# Altium footprint library My Footprint 3D.PCBLIB: 447 footprints (part 18 of 29)
Each footprint in its own frame and in the unit in brackets; x right, y up, seen from the top. Pads: shape width x height; smd on the part's side, far side on the other; paste and mask are expansions set on the pad; w line width, h text height; cw(c..) or ccw(c..) is an arc to the next point about the centre after c.
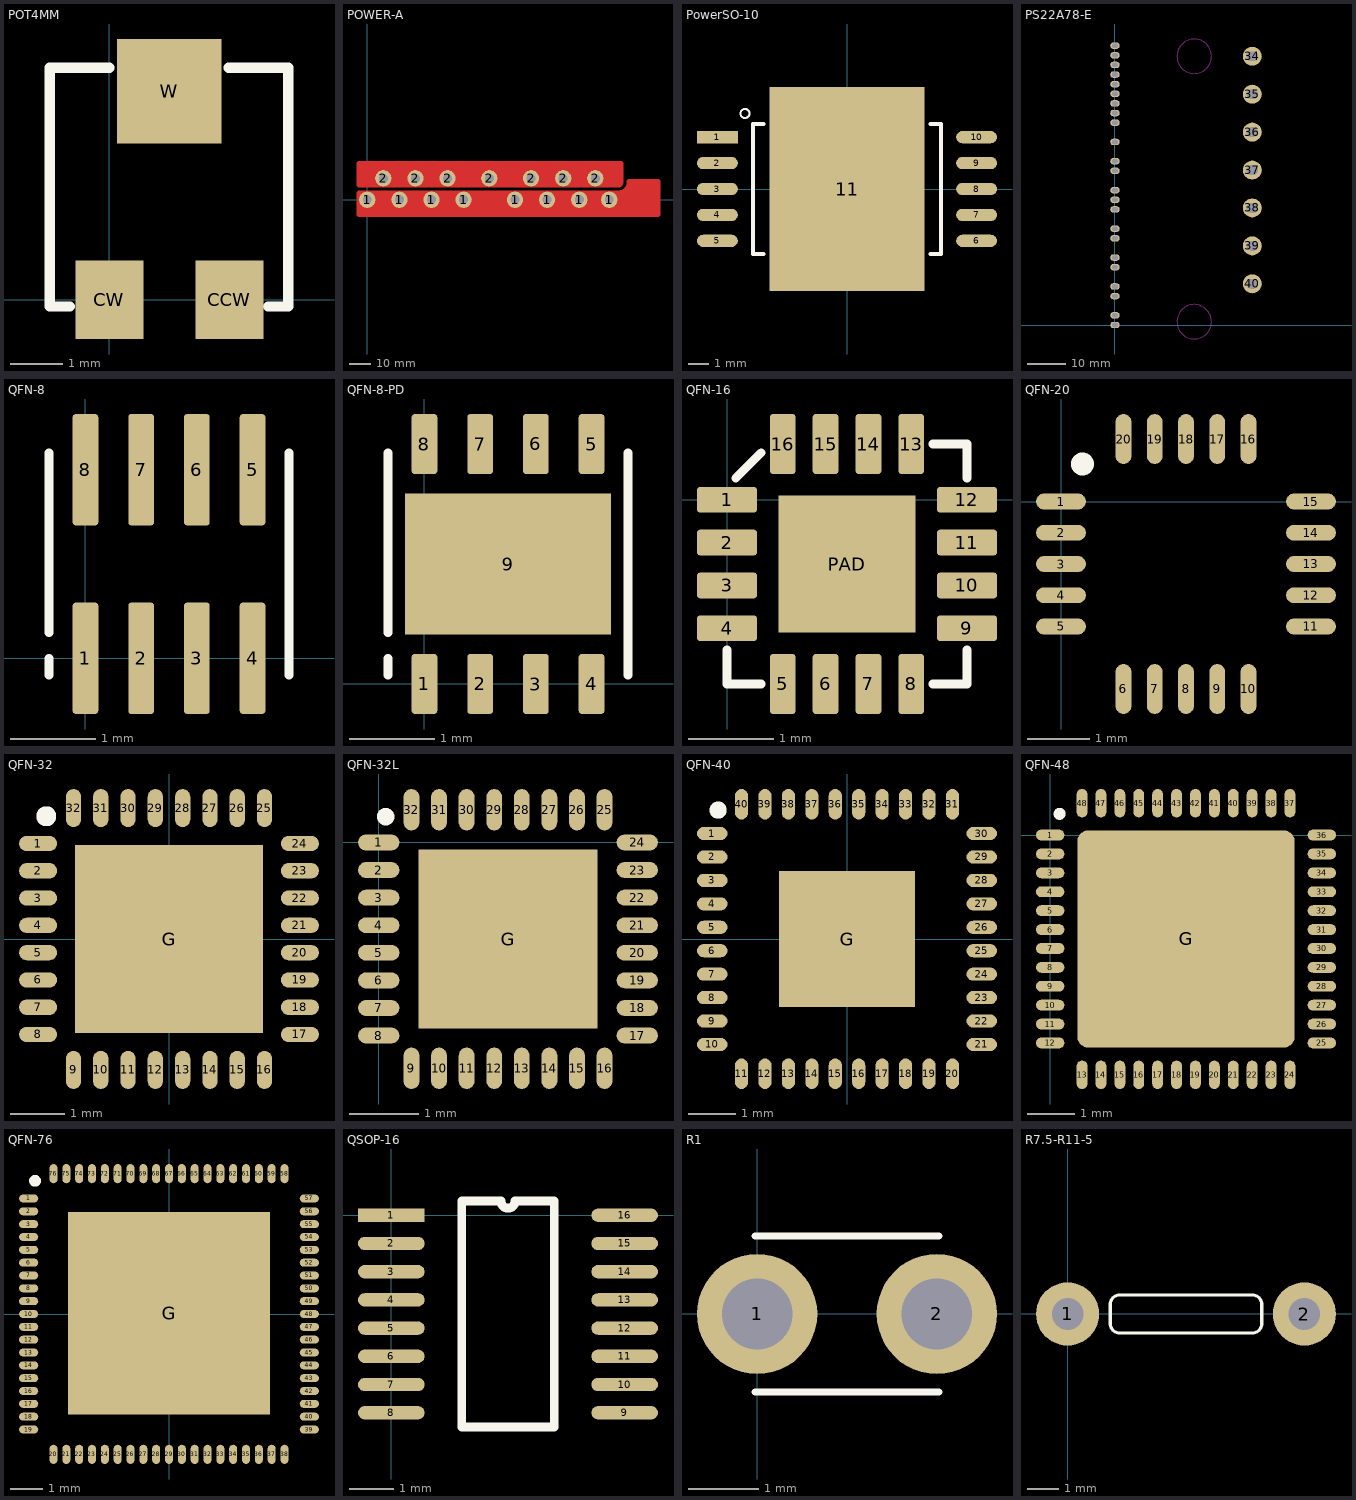
[diagram p17: the footprints below, top view; thin cyan lines are the x and y axes]

## POT4MM [mm] "Body 4.5X4.5mm"
height 2.55
pads (3):
  rect 1.3x1.5 smd: CCW(2.3,0) CW(0,0)
  rect 2x2 smd: W(1.15,4)
Top Overlay:
  lines w0.2: -0.762,-0.127 -1.143,-0.127 -1.143,4.445 0,4.445 ; 2.286,4.445 3.429,4.445 3.429,-0.127 3.048,-0.127

## POWER-A [mm]
pads (15):
  round 7.62 hole 4.2: 1(0,0) 1(15,0) 1(30,0) 1(45,0) 1(69,0) 1(84,0) 1(99,0) 1(113,0) 2(7.5,10) 2(22.5,10) 2(37.5,10) 2(57,10) 2(76.5,10) 2(91.5,10) 2(106.5,10)
Top Layer:
  rectangle: 121.666,0.508 135.636,7.874
  rectangle: -3.048,5.715 117.221,18.034
  rectangle: -3.302,-8.001 135.255,4.318
  lines w1.27: 117.221,3.674 ccw(c117.221,8.255) 121.802,8.255
  lines w2.54: -2.54,-6.731 -3.81,-6.731 -3.81,3.048 -0.127,3.048 ; -2.286,16.764 -3.81,16.764 -3.81,6.985 -1.651,6.985 ; 115.316,16.764 118.491,16.764 118.491,9.906 ; 117.221,7.239 117.221,16.002 ; 120.523,3.683 122.047,5.207 ; 122.428,7.62 122.428,8.382 135.763,8.382 135.763,-6.731 135.001,-6.731
  lines w5.08: 109.22,8.255 117.221,8.255 117.221,12.319
Top Solder:
  rectangle: 117.475,-6.731 135.128,8.763
  rectangle: -4.318,-7.747 119.126,16.891
  lines w2.7: -3.81,-6.731 -3.81,16.764 118.491,16.764 118.491,8.382 135.763,8.382 135.763,-6.731 -3.81,-6.731

## PowerSO-10 [mm]
pads (11):
  rect 2x0.6 smd: 1(-6.35,2.54)
  oval 2x0.6 smd: 2(-6.35,1.27) 3(-6.35,0) 4(-6.35,-1.27) 5(-6.35,-2.54) 6(6.35,-2.54) 7(6.35,-1.27) 8(6.35,0) 9(6.35,1.27) 10(6.35,2.54)
  rect 7.6x10 smd: 11(0,0)
Top Overlay:
  circle w0.1: c-5,3.7 r0.224
  lines w0.2: -4.1,-3.175 -4.615,-3.175 -4.615,3.175 -4.1,3.175 ; 4.1,-3.175 4.615,-3.175 4.615,3.175 4.1,3.175
3D body: height 1.9, standoff 1.6, extent -5.7,-0.3 -4.7,0.3
3D body: height 1.9, standoff 0, extent -6,-0.3 -5.7,0.3
3D body: height 0.3, standoff 0, extent -7,-0.3 -6,0.3
3D body: height 3.5, standoff 0.01, extent -4.7,-3.8 4.7,3.8
3D body: height 1.3, standoff 0, extent -3.7,-4.799 3.7,4.801
3D body: height 0.3, standoff 0, extent -7,-1.57 -6,-0.97
3D body: height 1.9, standoff 0, extent -6,-1.57 -5.7,-0.97
3D body: height 1.9, standoff 1.6, extent -5.7,-1.57 -4.7,-0.97
3D body: height 0.3, standoff 0, extent -7,-2.84 -6,-2.24
3D body: height 1.9, standoff 0, extent -6,-2.84 -5.7,-2.24
3D body: height 1.9, standoff 1.6, extent -5.7,-2.84 -4.7,-2.24
3D body: height 0.3, standoff 0, extent -7,0.97 -6,1.57
3D body: height 1.9, standoff 0, extent -6,0.97 -5.7,1.57
3D body: height 1.9, standoff 1.6, extent -5.7,0.97 -4.7,1.57
3D body: height 0.3, standoff 0, extent -7,2.24 -6,2.84
3D body: height 1.9, standoff 0, extent -6,2.24 -5.7,2.84
3D body: height 1.9, standoff 1.6, extent -5.7,2.24 -4.7,2.84
3D body: height 1.9, standoff 1.6, extent 4.7,-2.84 5.7,-2.24
3D body: height 1.9, standoff 0, extent 5.7,-2.84 6,-2.24
3D body: height 0.3, standoff 0, extent 6,-2.84 7,-2.24
3D body: height 1.9, standoff 1.6, extent 4.7,-1.57 5.7,-0.97
3D body: height 1.9, standoff 0, extent 5.7,-1.57 6,-0.97
3D body: height 0.3, standoff 0, extent 6,-1.57 7,-0.97
3D body: height 1.9, standoff 1.6, extent 4.7,2.24 5.7,2.84
3D body: height 1.9, standoff 0, extent 5.7,2.24 6,2.84
3D body: height 0.3, standoff 0, extent 6,2.24 7,2.84
3D body: height 1.9, standoff 1.6, extent 4.7,0.97 5.7,1.57
3D body: height 1.9, standoff 0, extent 5.7,0.97 6,1.57
3D body: height 0.3, standoff 0, extent 6,0.97 7,1.57
3D body: height 0.3, standoff 0, extent 6,-0.3 7,0.3
3D body: height 1.9, standoff 0, extent 5.7,-0.3 6,0.3
3D body: height 1.9, standoff 1.6, extent 4.7,-0.3 5.7,0.3

## PS22A78-E [mm]
pads (30):
  oval 2.5x1.7 hole 1.1 slot 1.5 at 0 deg: 1(0,0) 3(0,2.54) 4(0,7.62) 6(0,10.16) 7(0,15.24) 9(0,17.78) 10(0,22.86) 12(0,25.4) 13(0,30.48) 14(0,33.02) 15(0,35.56) 16(0,40.64) 18(0,43.18) 19(0,48.26) 21(0,53.34) 22(0,55.88) 23(0,58.42) 24(0,60.96) 25(0,63.5) 26(0,66.04) 27(0,68.58) 28(0,71.12) 29(0,73.66)
  round 5 hole 2.5 slot 3 at 0 deg: 34(36.2,70.86) 35(36.2,60.86) 36(36.2,50.86) 37(36.2,40.86) 38(36.2,30.86) 39(36.2,20.86) 40(36.2,10.86)
Bottom Overlay:
  circle w0.5: c5.593,0.137 r1
  lines w0.254: 2,-3.64 2,26.63 8,26.63 8,29.53 2,29.53 2,44.41 8,44.41 8,47.31 2,47.31 2,75.36 33.6,75.36 33.6,-3.64 2,-3.64
Keep-Out Layer:
  lines w0.254: 20.822,75.409 ccw(c20.9,70.86) 20.925,75.41 ; 20.9,5.41 ccw(c20.9,0.86) 20.975,5.409

## QFN-8 [mm]
pads (8):
  rrect25% 0.3x1.3 smd mask+0.05: 1(0,0) 2(0.65,0) 3(1.3,0) 4(1.95,0) 5(1.95,2.2) 6(1.3,2.2) 7(0.65,2.2) 8(0,2.2)
Top Overlay:
  lines w0.1: -0.425,-0.2 -0.425,0 ; -0.425,0.3 -0.425,2.4 ; 2.375,-0.2 2.375,2.4
3D body: height 0.2, standoff 0, extent 1.825,-0.425 2.075,0.05
3D body: height 0.2, standoff 0, extent 1.175,-0.425 1.425,0.05
3D body: height 0.2, standoff 0, extent 0.525,-0.425 0.775,0.05
3D body: height 0.2, standoff 0, extent -0.125,-0.425 0.125,0.05
3D body: height 0.2, standoff 0, extent 1.825,2.15 2.075,2.625
3D body: height 0.2, standoff 0, extent 1.175,2.15 1.425,2.625
3D body: height 0.2, standoff 0, extent 0.525,2.15 0.775,2.625
3D body: height 0.91, standoff 0.9, extent -0.225,0 0.175,0.4
3D body: height 0.9, standoff 0.02, extent -0.525,-0.4 2.475,2.6
3D body: height 0.2, standoff 0, extent -0.125,2.15 0.125,2.625

## QFN-8-PD [mm]
pads (9):
  rrect25% 0.3x0.7 smd mask+0.05: 1(0,0) 2(0.65,0) 3(1.3,0) 4(1.95,0) 5(1.95,2.8) 6(1.3,2.8) 7(0.65,2.8) 8(0,2.8)
  rect 2.4x1.65 smd mask+0.05: 9(0.975,1.4)
Top Overlay:
  lines w0.1: -0.425,0.1 -0.425,0.3 ; -0.425,0.6 -0.425,2.7 ; 2.375,0.1 2.375,2.7
3D body: height 0.2, standoff 0, extent -0.125,2.45 0.125,2.925
3D body: height 0.9, standoff 0.02, extent -0.525,-0.1 2.475,2.9
3D body: height 0.01, standoff 0, extent -0.225,0.6 2.175,2.2
3D body: height 0.91, standoff 0.9, extent -0.225,0.3 0.175,0.7
3D body: height 0.2, standoff 0, extent 0.525,2.45 0.775,2.925
3D body: height 0.2, standoff 0, extent 1.175,2.45 1.425,2.925
3D body: height 0.2, standoff 0, extent 1.825,2.45 2.075,2.925
3D body: height 0.2, standoff 0, extent -0.125,-0.125 0.125,0.35
3D body: height 0.2, standoff 0, extent 0.525,-0.125 0.775,0.35
3D body: height 0.2, standoff 0, extent 1.175,-0.125 1.425,0.35
3D body: height 0.2, standoff 0, extent 1.825,-0.125 2.075,0.35

## QFN-16 [mm]
pads (17):
  rrect25% 0.7x0.3 smd mask+0.05: 1(0,0) 2(0,-0.5) 3(0,-1) 4(0,-1.5) 9(2.8,-1.5) 10(2.8,-1) 11(2.8,-0.5) 12(2.8,0)
  rrect25% 0.3x0.7 smd mask+0.05: 5(0.65,-2.15) 6(1.15,-2.15) 7(1.65,-2.15) 8(2.15,-2.15) 13(2.15,0.65) 14(1.65,0.65) 15(1.15,0.65) 16(0.65,0.65)
  rect 1.6x1.6 smd mask+0.05: PAD(1.4,-0.75)
Top Overlay:
  lines w0.1: 0,-1.75 0,-2.15 0.4,-2.15 ; 0.1,0.25 0.4,0.55 ; 2.4,-2.15 2.8,-2.15 2.8,-1.75 ; 2.4,0.65 2.8,0.65 2.8,0.25
3D body: height 0.85, standoff 0.02, extent -0.1,-2.25 2.9,0.75
3D body: height 0.2, standoff 0, extent 0.525,0.25 0.775,0.775
3D body: height 0.2, standoff 0, extent 1.025,0.25 1.275,0.775
3D body: height 0.2, standoff 0, extent 1.525,0.25 1.775,0.775
3D body: height 0.2, standoff 0, extent 2.025,0.25 2.275,0.775
3D body: height 0.2, standoff 0, extent -0.125,-0.125 0.4,0.125
3D body: height 0.2, standoff 0, extent -0.125,-0.625 0.4,-0.375
3D body: height 0.2, standoff 0, extent -0.125,-1.125 0.4,-0.875
3D body: height 0.2, standoff 0, extent -0.125,-1.625 0.4,-1.375
3D body: height 0.2, standoff 0, extent 0.525,-2.275 0.775,-1.75
3D body: height 0.2, standoff 0, extent 1.025,-2.275 1.275,-1.75
3D body: height 0.2, standoff 0, extent 1.525,-2.275 1.775,-1.75
3D body: height 0.2, standoff 0, extent 2.025,-2.275 2.275,-1.75
3D body: height 0.2, standoff 0, extent 2.4,-1.625 2.925,-1.375
3D body: height 0.2, standoff 0, extent 2.4,-1.125 2.925,-0.875
3D body: height 0.2, standoff 0, extent 2.4,-0.625 2.925,-0.375
3D body: height 0.2, standoff 0, extent 2.4,-0.125 2.925,0.125
3D body: height 0.01, standoff 0, extent 0.6,-1.55 2.2,0.05
3D body: height 0.86, standoff 0.85, extent 0.2,0.05 0.6,0.45

## QFN-20 [mm]
pads (20):
  oval 0.8x0.254 smd: 1(0,0) 2(0,-0.5) 3(0,-1) 4(0,-1.5) 5(0,-2) 11(4,-2) 12(4,-1.5) 13(4,-1) 14(4,-0.5) 15(4,0)
  oval 0.254x0.8 smd: 6(1,-3) 7(1.5,-3) 8(2,-3) 9(2.5,-3) 10(3,-3) 16(3,1) 17(2.5,1) 18(2,1) 19(1.5,1) 20(1,1)
Top Overlay:
  circle w0.254: c0.344,0.6 r0.056
3D body: height 0.85, standoff 0.01, extent 0,-3 4,1
3D body: height 0.2, standoff 0, extent -0.025,-0.125 0.5,0.125
3D body: height 0.2, standoff 0, extent -0.025,-0.625 0.5,-0.375
3D body: height 0.2, standoff 0, extent -0.025,-1.125 0.5,-0.875
3D body: height 0.2, standoff 0, extent -0.025,-1.625 0.5,-1.375
3D body: height 0.2, standoff 0, extent -0.025,-2.125 0.5,-1.875
3D body: height 0.2, standoff 0, extent 2.875,-3.025 3.125,-2.5
3D body: height 0.2, standoff 0, extent 2.375,-3.025 2.625,-2.5
3D body: height 0.2, standoff 0, extent 1.875,-3.025 2.125,-2.5
3D body: height 0.2, standoff 0, extent 1.375,-3.025 1.625,-2.5
3D body: height 0.2, standoff 0, extent 0.875,-3.025 1.125,-2.5
3D body: height 0.2, standoff 0, extent 3.5,-0.125 4.025,0.125
3D body: height 0.2, standoff 0, extent 3.5,-0.625 4.025,-0.375
3D body: height 0.2, standoff 0, extent 3.5,-1.125 4.025,-0.875
3D body: height 0.2, standoff 0, extent 3.5,-1.625 4.025,-1.375
3D body: height 0.2, standoff 0, extent 3.5,-2.125 4.025,-1.875
3D body: height 0.2, standoff 0, extent 0.875,0.5 1.125,1.025
3D body: height 0.2, standoff 0, extent 1.375,0.5 1.625,1.025
3D body: height 0.2, standoff 0, extent 1.875,0.5 2.125,1.025
3D body: height 0.2, standoff 0, extent 2.375,0.5 2.625,1.025
3D body: height 0.2, standoff 0, extent 2.875,0.5 3.125,1.025
3D body: height 0.2, standoff 0, extent 0.7,-2.3 3.3,0.3

## QFN-32 [mm]
pads (33):
  oval 0.7x0.28 smd: 1(-2.4,1.75) 2(-2.4,1.25) 3(-2.4,0.75) 4(-2.4,0.25) 5(-2.4,-0.25) 6(-2.4,-0.75) 7(-2.4,-1.25) 8(-2.4,-1.75) 17(2.4,-1.75) 18(2.4,-1.25) 19(2.4,-0.75) 20(2.4,-0.25) 21(2.4,0.25) 22(2.4,0.75) 23(2.4,1.25) 24(2.4,1.75)
  oval 0.28x0.7 smd: 9(-1.75,-2.4) 10(-1.25,-2.4) 11(-0.75,-2.4) 12(-0.25,-2.4) 13(0.25,-2.4) 14(0.75,-2.4) 15(1.25,-2.4) 16(1.75,-2.4) 25(1.75,2.4) 26(1.25,2.4) 27(0.75,2.4) 28(0.25,2.4) 29(-0.25,2.4) 30(-0.75,2.4) 31(-1.25,2.4) 32(-1.75,2.4)
  rect 3.45x3.45 smd: G(0,0)
Top Overlay:
  circle w0.254: c-2.25,2.25 r0.056
3D body: height 0.3, standoff 0, extent -1.89,2.049 -1.61,2.51
3D body: height 0.3, standoff 0, extent -1.39,2.049 -1.11,2.51
3D body: height 0.3, standoff 0, extent -0.89,2.049 -0.61,2.51
3D body: height 0.3, standoff 0, extent -0.39,2.049 -0.11,2.51
3D body: height 0.3, standoff 0, extent 0.11,2.049 0.39,2.51
3D body: height 0.3, standoff 0, extent 0.61,2.049 0.89,2.51
3D body: height 0.3, standoff 0, extent 1.11,2.049 1.39,2.51
3D body: height 0.3, standoff 0, extent 1.61,2.049 1.89,2.51
3D body: height 0.3, standoff 0, extent 2.049,1.61 2.51,1.89
3D body: height 0.3, standoff 0, extent 2.049,1.11 2.51,1.39
3D body: height 0.3, standoff 0, extent 2.049,0.61 2.51,0.89
3D body: height 0.3, standoff 0, extent 2.049,0.11 2.51,0.39
3D body: height 0.3, standoff 0, extent 2.049,-0.39 2.51,-0.11
3D body: height 0.3, standoff 0, extent 2.049,-0.89 2.51,-0.61
3D body: height 0.3, standoff 0, extent 2.049,-1.39 2.51,-1.11
3D body: height 0.3, standoff 0, extent 2.049,-1.89 2.51,-1.61
3D body: height 0.3, standoff 0, extent 1.61,-2.51 1.89,-2.049
3D body: height 0.3, standoff 0, extent 1.11,-2.51 1.39,-2.049
3D body: height 0.3, standoff 0, extent 0.61,-2.51 0.89,-2.049
3D body: height 0.3, standoff 0, extent 0.11,-2.51 0.39,-2.049
3D body: height 0.3, standoff 0, extent -0.39,-2.51 -0.11,-2.049
3D body: height 0.3, standoff 0, extent -0.89,-2.51 -0.61,-2.049
3D body: height 0.3, standoff 0, extent -1.39,-2.51 -1.11,-2.049
3D body: height 0.3, standoff 0, extent -1.89,-2.51 -1.61,-2.049
3D body: height 0.3, standoff 0, extent -2.51,1.61 -2.049,1.89
3D body: height 0.3, standoff 0, extent -2.51,1.11 -2.049,1.39
3D body: height 0.3, standoff 0, extent -2.51,0.61 -2.049,0.89
3D body: height 0.3, standoff 0, extent -2.51,0.11 -2.049,0.39
3D body: height 0.3, standoff 0, extent -2.51,-0.39 -2.049,-0.11
3D body: height 0.3, standoff 0, extent -2.51,-0.89 -2.049,-0.61
3D body: height 0.3, standoff 0, extent -2.51,-1.39 -2.049,-1.11
3D body: height 0.3, standoff 0, extent -2.51,-1.89 -2.049,-1.61
3D body: height 0.3, standoff 0, extent -1.72,-1.72 1.72,1.72
3D body: height 0.85, standoff 0.02, extent -2.5,-2.5 2.5,2.5
3D body: height 0.86, standoff 0.85, extent -2.025,1.625 -1.625,2.025

## QFN-32L [mm] "4mmX4mm"
pads (33):
  oval 0.6x0.23 smd: 1(0,0) 2(0,-0.4) 3(0,-0.8) 4(0,-1.2) 5(0,-1.6) 6(0,-2) 7(0,-2.4) 8(0.001,-2.801) 17(3.751,-2.8) 18(3.751,-2.4) 19(3.751,-2) 20(3.751,-1.6) 21(3.75,-1.2) 22(3.75,-0.8) 23(3.75,-0.4) 24(3.75,0)
  oval 0.23x0.6 smd: 9(0.475,-3.275) 10(0.875,-3.275) 11(1.275,-3.275) 12(1.676,-3.275) 13(2.076,-3.275) 14(2.476,-3.275) 15(2.876,-3.275) 16(3.276,-3.275) 25(3.275,0.475) 26(2.875,0.475) 27(2.475,0.475) 28(2.075,0.475) 29(1.675,0.475) 30(1.275,0.475) 31(0.875,0.475) 32(0.475,0.475)
  rect 2.6x2.6 smd: G(1.875,-1.4)
Top Overlay:
  circle w0.254: c0.1,0.375 r0
3D body: height 0.25, standoff 0, extent 0.575,-2.7 3.175,-0.1
3D body: height 0.25, standoff 0, extent 3.475,-0.1 3.885,0.1
3D body: height 0.25, standoff 0, extent 3.176,0.2 3.376,0.61
3D body: height 0.25, standoff 0, extent 3.176,-3.41 3.376,-3
3D body: height 0.25, standoff 0, extent 3.475,-2.9 3.885,-2.7
3D body: height 0.25, standoff 0, extent -0.134,-2.9 0.276,-2.7
3D body: height 0.25, standoff 0, extent 0.375,-3.41 0.575,-3
3D body: height 0.8, standoff 0.02, extent -0.125,-3.4 3.875,0.6
3D body: height 0.25, standoff 0, extent -0.134,-0.1 0.276,0.1
3D body: height 0.25, standoff 0, extent 1.975,0.2 2.175,0.61
3D body: height 0.25, standoff 0, extent 1.575,0.2 1.775,0.61
3D body: height 0.25, standoff 0, extent 1.175,0.2 1.375,0.61
3D body: height 0.25, standoff 0, extent 0.775,0.2 0.975,0.61
3D body: height 0.25, standoff 0, extent 0.375,0.199 0.575,0.609
3D body: height 0.25, standoff 0, extent 2.375,0.2 2.575,0.61
3D body: height 0.25, standoff 0, extent 2.776,0.2 2.976,0.61
3D body: height 0.25, standoff 0, extent 3.475,-1.7 3.885,-1.5
3D body: height 0.25, standoff 0, extent 3.475,-1.3 3.885,-1.1
3D body: height 0.25, standoff 0, extent 3.475,-0.9 3.885,-0.7
3D body: height 0.25, standoff 0, extent 3.475,-0.5 3.885,-0.3
3D body: height 0.25, standoff 0, extent 3.475,-2.1 3.885,-1.9
3D body: height 0.25, standoff 0, extent 3.475,-2.5 3.885,-2.3
3D body: height 0.25, standoff 0, extent 1.575,-3.41 1.775,-3
3D body: height 0.25, standoff 0, extent 1.975,-3.41 2.175,-3
3D body: height 0.25, standoff 0, extent 2.375,-3.41 2.575,-3
3D body: height 0.25, standoff 0, extent 2.775,-3.41 2.975,-3
3D body: height 0.25, standoff 0, extent 1.175,-3.41 1.375,-3
3D body: height 0.25, standoff 0, extent 0.775,-3.41 0.975,-3
3D body: height 0.25, standoff 0, extent -0.134,-0.5 0.276,-0.3
3D body: height 0.25, standoff 0, extent -0.135,-0.9 0.275,-0.7
3D body: height 0.25, standoff 0, extent -0.134,-2.5 0.276,-2.3
3D body: height 0.25, standoff 0, extent -0.134,-2.1 0.276,-1.9
3D body: height 0.25, standoff 0, extent -0.135,-1.7 0.275,-1.5
3D body: height 0.25, standoff 0, extent -0.135,-1.3 0.275,-1.1
3D body: height 0.81, standoff 0.8, extent 0.227,-0.15 0.626,0.25

## QFN-40 [mm]
pads (41):
  oval 0.65x0.28 smd: 1(-2.875,2.25) 2(-2.875,1.75) 3(-2.875,1.25) 4(-2.875,0.75) 5(-2.875,0.25) 6(-2.875,-0.25) 7(-2.875,-0.75) 8(-2.875,-1.25) 9(-2.875,-1.75) 10(-2.875,-2.25) 21(2.875,-2.25) 22(2.875,-1.75) 23(2.875,-1.25) 24(2.875,-0.75) 25(2.875,-0.25) 26(2.875,0.25) 27(2.875,0.75) 28(2.875,1.25) 29(2.875,1.75) 30(2.875,2.25)
  oval 0.28x0.65 smd: 11(-2.25,-2.875) 12(-1.75,-2.875) 13(-1.25,-2.875) 14(-0.75,-2.875) 15(-0.25,-2.875) 16(0.25,-2.875) 17(0.75,-2.875) 18(1.25,-2.875) 19(1.75,-2.875) 20(2.25,-2.875) 31(2.25,2.875) 32(1.75,2.875) 33(1.25,2.875) 34(0.75,2.875) 35(0.25,2.875) 36(-0.25,2.875) 37(-0.75,2.875) 38(-1.25,2.875) 39(-1.75,2.875) 40(-2.25,2.875)
  rect 2.9x2.9 smd: G(0,0)
Top Overlay:
  circle w0.254: c-2.75,2.75 r0.056
3D body: height 0.2, standoff 0, extent 2.138,2.574 2.362,3.025
3D body: height 0.2, standoff 0, extent 1.638,2.574 1.862,3.025
3D body: height 0.2, standoff 0, extent 1.138,2.574 1.362,3.025
3D body: height 0.2, standoff 0, extent 0.638,2.574 0.862,3.025
3D body: height 0.2, standoff 0, extent 0.138,2.574 0.362,3.025
3D body: height 0.2, standoff 0, extent -0.362,2.574 -0.138,3.025
3D body: height 0.2, standoff 0, extent -0.862,2.574 -0.638,3.025
3D body: height 0.2, standoff 0, extent -1.362,2.574 -1.138,3.025
3D body: height 0.2, standoff 0, extent -1.862,2.574 -1.638,3.025
3D body: height 0.2, standoff 0, extent -2.362,2.574 -2.138,3.025
3D body: height 0.2, standoff 0, extent 2.574,-2.362 3.025,-2.138
3D body: height 0.2, standoff 0, extent 2.574,-1.862 3.025,-1.638
3D body: height 0.2, standoff 0, extent 2.574,-1.362 3.025,-1.138
3D body: height 0.2, standoff 0, extent 2.574,-0.862 3.025,-0.638
3D body: height 0.2, standoff 0, extent 2.574,-0.362 3.025,-0.138
3D body: height 0.2, standoff 0, extent 2.574,0.138 3.025,0.362
3D body: height 0.2, standoff 0, extent 2.574,0.638 3.025,0.862
3D body: height 0.2, standoff 0, extent 2.574,1.138 3.025,1.362
3D body: height 0.2, standoff 0, extent 2.574,1.638 3.025,1.862
3D body: height 0.2, standoff 0, extent 2.574,2.138 3.025,2.362
3D body: height 0.2, standoff 0, extent -2.362,-3.025 -2.138,-2.574
3D body: height 0.2, standoff 0, extent -1.862,-3.025 -1.638,-2.574
3D body: height 0.2, standoff 0, extent -1.362,-3.025 -1.138,-2.574
3D body: height 0.2, standoff 0, extent -0.862,-3.025 -0.638,-2.574
3D body: height 0.2, standoff 0, extent -0.362,-3.025 -0.138,-2.574
3D body: height 0.2, standoff 0, extent 0.138,-3.025 0.362,-2.574
3D body: height 0.2, standoff 0, extent 0.638,-3.025 0.862,-2.574
3D body: height 0.2, standoff 0, extent 1.138,-3.025 1.362,-2.574
3D body: height 0.2, standoff 0, extent 1.638,-3.025 1.862,-2.574
3D body: height 0.2, standoff 0, extent 2.138,-3.025 2.362,-2.574
3D body: height 0.2, standoff 0, extent -3.025,-2.362 -2.574,-2.138
3D body: height 0.2, standoff 0, extent -3.025,-1.862 -2.574,-1.638
3D body: height 0.2, standoff 0, extent -3.025,-1.362 -2.574,-1.138
3D body: height 0.2, standoff 0, extent -3.025,-0.862 -2.574,-0.638
3D body: height 0.2, standoff 0, extent -3.025,-0.362 -2.574,-0.138
3D body: height 0.2, standoff 0, extent -3.025,0.138 -2.574,0.362
3D body: height 0.2, standoff 0, extent -3.025,0.638 -2.574,0.862
3D body: height 0.2, standoff 0, extent -3.025,1.138 -2.574,1.362
3D body: height 0.2, standoff 0, extent -3.025,1.638 -2.574,1.862
3D body: height 0.2, standoff 0, extent -3.025,2.138 -2.574,2.362
3D body: height 0.86, standoff 0.85, extent -2.523,2.125 -2.125,2.525
3D body: height 0.85, standoff 0.05, extent -3,-3 3,3
3D body: height 0.3, standoff 0, extent -1.45,-1.45 1.45,1.45

## QFN-48 [mm]
pads (49):
  oval 0.6x0.23 smd: 1(0,0) 2(0,-0.4) 3(0,-0.8) 4(0,-1.2) 5(0,-1.6) 6(0,-2) 7(0,-2.4) 8(0,-2.8) 9(0,-3.2) 10(0,-3.6) 11(0,-4) 12(0,-4.4) 25(5.75,-4.4) 26(5.75,-4) 27(5.75,-3.6) 28(5.75,-3.2) 29(5.75,-2.8) 30(5.75,-2.4) 31(5.75,-2) 32(5.75,-1.6) 33(5.75,-1.2) 34(5.75,-0.8) 35(5.75,-0.4) 36(5.75,0)
  oval 0.23x0.6 smd: 13(0.675,-5.075) 14(1.075,-5.075) 15(1.475,-5.075) 16(1.875,-5.075) 17(2.275,-5.075) 18(2.675,-5.075) 19(3.075,-5.075) 20(3.475,-5.075) 21(3.875,-5.075) 22(4.275,-5.075) 23(4.675,-5.075) 24(5.075,-5.075) 37(5.075,0.675) 38(4.675,0.675) 39(4.275,0.675) 40(3.875,0.675) 41(3.475,0.675) 42(3.075,0.675) 43(2.675,0.675) 44(2.275,0.675) 45(1.875,0.675) 46(1.475,0.675) 47(1.075,0.675) 48(0.675,0.675)
  rrect10% 4.6x4.6 smd: G(2.875,-2.2)
Top Overlay:
  circle w0.254: c0.2,0.45 r0
3D body: height 0.86, standoff 0.85, extent 0.327,-0.074 0.725,0.325
3D body: height 0.85, standoff 0.01, extent -0.125,-5.2 5.875,0.8
3D body: height 0.2, standoff 0, extent -0.135,-2.1 0.275,-1.9
3D body: height 0.2, standoff 0, extent -0.135,-2.5 0.275,-2.3
3D body: height 0.2, standoff 0, extent -0.135,-2.9 0.275,-2.7
3D body: height 0.2, standoff 0, extent -0.135,-3.3 0.275,-3.1
3D body: height 0.2, standoff 0, extent -0.135,-3.7 0.275,-3.5
3D body: height 0.2, standoff 0, extent -0.135,-4.1 0.275,-3.9
3D body: height 0.2, standoff 0, extent -0.135,-4.5 0.275,-4.3
3D body: height 0.2, standoff 0, extent -0.135,-0.1 0.275,0.1
3D body: height 0.2, standoff 0, extent -0.135,-0.5 0.275,-0.3
3D body: height 0.2, standoff 0, extent -0.135,-0.9 0.275,-0.7
3D body: height 0.2, standoff 0, extent -0.135,-1.3 0.275,-1.1
3D body: height 0.2, standoff 0, extent -0.135,-1.7 0.275,-1.5
3D body: height 0.2, standoff 0, extent 2.175,-5.21 2.375,-4.8
3D body: height 0.2, standoff 0, extent 1.775,-5.21 1.975,-4.8
3D body: height 0.2, standoff 0, extent 1.375,-5.21 1.575,-4.8
3D body: height 0.2, standoff 0, extent 0.975,-5.21 1.175,-4.8
3D body: height 0.2, standoff 0, extent 0.575,-5.21 0.775,-4.8
3D body: height 0.2, standoff 0, extent 4.975,-5.21 5.175,-4.8
3D body: height 0.2, standoff 0, extent 4.575,-5.21 4.775,-4.8
3D body: height 0.2, standoff 0, extent 4.175,-5.21 4.375,-4.8
3D body: height 0.2, standoff 0, extent 3.775,-5.21 3.975,-4.8
3D body: height 0.2, standoff 0, extent 3.375,-5.21 3.575,-4.8
3D body: height 0.2, standoff 0, extent 2.975,-5.21 3.175,-4.8
3D body: height 0.2, standoff 0, extent 2.575,-5.21 2.775,-4.8
3D body: height 0.2, standoff 0, extent 5.475,-2.9 5.885,-2.7
3D body: height 0.2, standoff 0, extent 5.475,-3.3 5.885,-3.1
3D body: height 0.2, standoff 0, extent 5.475,-3.7 5.885,-3.5
3D body: height 0.2, standoff 0, extent 5.475,-4.1 5.885,-3.9
3D body: height 0.2, standoff 0, extent 5.475,-4.5 5.885,-4.3
3D body: height 0.2, standoff 0, extent 5.475,-0.1 5.885,0.1
3D body: height 0.2, standoff 0, extent 5.475,-0.5 5.885,-0.3
3D body: height 0.2, standoff 0, extent 5.475,-0.9 5.885,-0.7
3D body: height 0.2, standoff 0, extent 5.475,-1.3 5.885,-1.1
3D body: height 0.2, standoff 0, extent 5.475,-1.7 5.885,-1.5
3D body: height 0.2, standoff 0, extent 5.475,-2.1 5.885,-1.9
3D body: height 0.2, standoff 0, extent 5.475,-2.5 5.885,-2.3
3D body: height 0.2, standoff 0, extent 3.375,0.4 3.575,0.81
3D body: height 0.2, standoff 0, extent 3.775,0.4 3.975,0.81
3D body: height 0.2, standoff 0, extent 4.175,0.4 4.375,0.81
3D body: height 0.2, standoff 0, extent 4.575,0.4 4.775,0.81
3D body: height 0.2, standoff 0, extent 4.975,0.4 5.175,0.81
3D body: height 0.2, standoff 0, extent 0.575,0.4 0.775,0.81
3D body: height 0.2, standoff 0, extent 0.975,0.4 1.175,0.81
3D body: height 0.2, standoff 0, extent 1.375,0.4 1.575,0.81
3D body: height 0.2, standoff 0, extent 1.775,0.4 1.975,0.81
3D body: height 0.2, standoff 0, extent 2.175,0.4 2.375,0.81
3D body: height 0.2, standoff 0, extent 2.575,0.4 2.775,0.81
3D body: height 0.2, standoff 0, extent 2.975,0.4 3.175,0.81

## QFN-76 [mm]
pads (77):
  oval 0.6x0.25 smd: 1(-4.375,3.6) 2(-4.375,3.2) 3(-4.375,2.8) 4(-4.375,2.4) 5(-4.375,2) 6(-4.375,1.6) 7(-4.375,1.2) 8(-4.375,0.8) 9(-4.375,0.4) 10(-4.375,0) 11(-4.375,-0.4) 12(-4.375,-0.8) 13(-4.375,-1.2) 14(-4.375,-1.6) 15(-4.375,-2) 16(-4.375,-2.4) 17(-4.375,-2.8) 18(-4.375,-3.2) 19(-4.375,-3.6) 39(4.375,-3.6) 40(4.375,-3.2) 41(4.375,-2.8) 42(4.375,-2.4) 43(4.375,-2) 44(4.375,-1.6) 45(4.375,-1.2) 46(4.375,-0.8) 47(4.375,-0.4) 48(4.375,0) 49(4.375,0.4) 50(4.375,0.8) 51(4.375,1.2) 52(4.375,1.6) 53(4.375,2) 54(4.375,2.4) 55(4.375,2.8) 56(4.375,3.2) 57(4.375,3.6)
  oval 0.25x0.6 smd: 20(-3.6,-4.375) 21(-3.2,-4.375) 22(-2.8,-4.375) 23(-2.4,-4.375) 24(-2,-4.375) 25(-1.6,-4.375) 26(-1.2,-4.375) 27(-0.8,-4.375) 28(-0.4,-4.375) 29(0,-4.375) 30(0.4,-4.375) 31(0.8,-4.375) 32(1.2,-4.375) 33(1.6,-4.375) 34(2,-4.375) 35(2.4,-4.375) 36(2.8,-4.375) 37(3.2,-4.375) 38(3.6,-4.375) 58(3.6,4.375) 59(3.2,4.375) 60(2.8,4.375) 61(2.4,4.375) 62(2,4.375) 63(1.6,4.375) 64(1.2,4.375) 65(0.8,4.375) 66(0.4,4.375) 67(0,4.375) 68(-0.4,4.375) 69(-0.8,4.375) 70(-1.2,4.375) 71(-1.6,4.375) 72(-2,4.375) 73(-2.4,4.375) 74(-2.8,4.375) 75(-3.2,4.375) 76(-3.6,4.375)
  rect 6.3x6.3 smd: G(0,0.025)
Top Overlay:
  circle w0.254: c-4.175,4.15 r0.056
3D body: height 0.85, standoff 0.01, extent -4.5,-4.5 4.5,4.5
3D body: height 0.2, standoff 0, extent -4.51,-2.5 -4.1,-2.3
3D body: height 0.2, standoff 0, extent -4.51,-2.9 -4.1,-2.7
3D body: height 0.2, standoff 0, extent -4.51,-1.7 -4.1,-1.5
3D body: height 0.2, standoff 0, extent -4.51,-2.1 -4.1,-1.9
3D body: height 0.2, standoff 0, extent -4.51,-0.9 -4.1,-0.7
3D body: height 0.2, standoff 0, extent -4.51,-1.3 -4.1,-1.1
3D body: height 0.2, standoff 0, extent -4.51,2.3 -4.1,2.5
3D body: height 0.2, standoff 0, extent -4.51,2.7 -4.1,2.9
3D body: height 0.2, standoff 0, extent -4.51,1.5 -4.1,1.7
3D body: height 0.2, standoff 0, extent -4.51,1.9 -4.1,2.1
3D body: height 0.2, standoff 0, extent -4.51,0.7 -4.1,0.9
3D body: height 0.2, standoff 0, extent -4.51,1.1 -4.1,1.3
3D body: height 0.2, standoff 0, extent -4.51,-0.5 -4.1,-0.3
3D body: height 0.2, standoff 0, extent -4.51,0.3 -4.1,0.5
3D body: height 0.2, standoff 0, extent -4.51,-0.1 -4.1,0.1
3D body: height 0.2, standoff 0, extent -4.51,3.5 -4.1,3.7
3D body: height 0.2, standoff 0, extent -4.51,3.1 -4.1,3.3
3D body: height 0.2, standoff 0, extent -4.51,-3.7 -4.1,-3.5
3D body: height 0.2, standoff 0, extent -4.51,-3.3 -4.1,-3.1
3D body: height 0.2, standoff 0, extent 3.1,-4.51 3.3,-4.1
3D body: height 0.2, standoff 0, extent 3.5,-4.51 3.7,-4.1
3D body: height 0.2, standoff 0, extent -3.3,-4.51 -3.1,-4.1
3D body: height 0.2, standoff 0, extent -3.7,-4.51 -3.5,-4.1
3D body: height 0.2, standoff 0, extent -0.1,-4.51 0.1,-4.1
3D body: height 0.2, standoff 0, extent -0.5,-4.51 -0.3,-4.1
3D body: height 0.2, standoff 0, extent 0.3,-4.51 0.5,-4.1
3D body: height 0.2, standoff 0, extent -1.3,-4.51 -1.1,-4.1
3D body: height 0.2, standoff 0, extent -0.9,-4.51 -0.7,-4.1
3D body: height 0.2, standoff 0, extent -2.1,-4.51 -1.9,-4.1
3D body: height 0.2, standoff 0, extent -1.7,-4.51 -1.5,-4.1
3D body: height 0.2, standoff 0, extent -2.9,-4.51 -2.7,-4.1
3D body: height 0.2, standoff 0, extent -2.5,-4.51 -2.3,-4.1
3D body: height 0.2, standoff 0, extent 1.1,-4.51 1.3,-4.1
3D body: height 0.2, standoff 0, extent 0.7,-4.51 0.9,-4.1
3D body: height 0.2, standoff 0, extent 1.9,-4.51 2.1,-4.1
3D body: height 0.2, standoff 0, extent 1.5,-4.51 1.7,-4.1
3D body: height 0.2, standoff 0, extent 2.7,-4.51 2.9,-4.1
3D body: height 0.2, standoff 0, extent 2.3,-4.51 2.5,-4.1
3D body: height 0.2, standoff 0, extent 4.1,3.1 4.51,3.3
3D body: height 0.2, standoff 0, extent 4.1,3.5 4.51,3.7
3D body: height 0.2, standoff 0, extent 4.1,-3.3 4.51,-3.1
3D body: height 0.2, standoff 0, extent 4.1,-3.7 4.51,-3.5
3D body: height 0.2, standoff 0, extent 4.1,-0.1 4.51,0.1
3D body: height 0.2, standoff 0, extent 4.1,-0.5 4.51,-0.3
3D body: height 0.2, standoff 0, extent 4.1,0.3 4.51,0.5
3D body: height 0.2, standoff 0, extent 4.1,-1.3 4.51,-1.1
3D body: height 0.2, standoff 0, extent 4.1,-0.9 4.51,-0.7
3D body: height 0.2, standoff 0, extent 4.1,-2.1 4.51,-1.9
3D body: height 0.2, standoff 0, extent 4.1,-1.7 4.51,-1.5
3D body: height 0.2, standoff 0, extent 4.1,-2.9 4.51,-2.7
3D body: height 0.2, standoff 0, extent 4.1,-2.5 4.51,-2.3
3D body: height 0.2, standoff 0, extent 4.1,1.1 4.51,1.3
3D body: height 0.2, standoff 0, extent 4.1,0.7 4.51,0.9
3D body: height 0.2, standoff 0, extent 4.1,1.9 4.51,2.1
3D body: height 0.2, standoff 0, extent 4.1,1.5 4.51,1.7
3D body: height 0.2, standoff 0, extent 4.1,2.7 4.51,2.9
3D body: height 0.2, standoff 0, extent 4.1,2.3 4.51,2.5
3D body: height 0.2, standoff 0, extent -3.3,4.1 -3.1,4.51
3D body: height 0.2, standoff 0, extent -3.7,4.1 -3.5,4.51
3D body: height 0.2, standoff 0, extent 3.1,4.1 3.3,4.51
3D body: height 0.2, standoff 0, extent 3.5,4.1 3.7,4.51
3D body: height 0.2, standoff 0, extent -0.1,4.1 0.1,4.51
3D body: height 0.2, standoff 0, extent 0.3,4.1 0.5,4.51
3D body: height 0.2, standoff 0, extent -0.5,4.1 -0.3,4.51
3D body: height 0.2, standoff 0, extent 1.1,4.1 1.3,4.51
3D body: height 0.2, standoff 0, extent 0.7,4.1 0.9,4.51
3D body: height 0.2, standoff 0, extent 1.9,4.1 2.1,4.51
3D body: height 0.2, standoff 0, extent 1.5,4.1 1.7,4.51
3D body: height 0.2, standoff 0, extent 2.7,4.1 2.9,4.51
3D body: height 0.2, standoff 0, extent 2.3,4.1 2.5,4.51
3D body: height 0.2, standoff 0, extent -1.3,4.1 -1.1,4.51
3D body: height 0.2, standoff 0, extent -0.9,4.1 -0.7,4.51
3D body: height 0.2, standoff 0, extent -2.1,4.1 -1.9,4.51
3D body: height 0.2, standoff 0, extent -1.7,4.1 -1.5,4.51
3D body: height 0.2, standoff 0, extent -2.9,4.1 -2.7,4.51
3D body: height 0.2, standoff 0, extent -2.5,4.1 -2.3,4.51
3D body: height 0.2, standoff 0, extent -3.15,-3.15 3.15,3.15
3D body: height 0.86, standoff 0.85, extent -3.948,3.525 -3.55,3.925

## QSOP-16 [mm]
pads (16):
  rect 1.5x0.3 smd: 1(0,0)
  oval 1.5x0.3 smd: 2(0,-0.635) 3(0,-1.27) 4(0,-1.905) 5(0,-2.54) 6(0,-3.175) 7(0,-3.81) 8(0,-4.445) 9(5.25,-4.445) 10(5.25,-3.81) 11(5.25,-3.175) 12(5.25,-2.54) 13(5.25,-1.905) 14(5.25,-1.27) 15(5.25,-0.635) 16(5.25,0)
Top Overlay:
  lines w0.2: 1.585,-4.763 3.665,-4.763 3.665,0.318 2.784,0.318 cw(c2.625,0.318) 2.466,0.318 1.585,0.318 1.585,-4.763

## R1 [mm]
pads (2):
  round 1.7 hole 1: 1(0,0) 2(2.54,0)
Top Overlay:
  lines w0.1: -0.03,-1.1 2.57,-1.1 ; -0.03,1.1 2.57,1.1
3D body: height 12.98, standoff -2.01, extent -0.159,-0.198 1.285,0.2
3D body: height 12.98, standoff -2.01, extent 1.255,-0.2 2.699,0.198
3D body: height 16, standoff 10, extent 0.27,-1 2.27,1

## R7.5-R11-5 [mm]
pads (2):
  round 2 hole 1: 1(0,0) 2(7.5,0)
Top Overlay:
  lines w0.1: 1.65,-0.6 ccw(c1.65,-0.6) 1.65,-0.6 ; 1.65,-0.6 5.85,-0.6 ccw(c5.85,-0.3) 6.15,-0.3 6.15,0.3 ccw(c5.85,0.3) 5.85,0.6 ; 1.65,-0.6 1.65,-0.6 cw(c1.65,-0.3) 1.35,-0.3 1.35,0.3 cw(c1.65,0.3) 1.65,0.6 5.85,0.6 ; 5.85,0.6 ccw(c5.85,0.6) 5.85,0.6
3D body: height 14.99, standoff 3.01, extent -1.976,-2.5 9.976,2.5
3D body: height 5.43, standoff 0.5, extent -0.595,-0.599 2.941,0.599
3D body: height 1, standoff -2, extent -0.298,-0.299 0.3,0.3
3D body: height 1.2, standoff 0.4, extent -0.595,-0.599 0.6,0.599
3D body: height 1.2, standoff 0.4, extent 6.9,-0.599 8.095,0.599
3D body: height 1, standoff -2, extent 7.2,-0.299 7.798,0.299
3D body: height 5.43, standoff 0.5, extent 4.559,-0.599 8.095,0.599